# Altium integrated library LED-SMD_V2.IntLib: 212 symbols (continued)
## ORANGE_ZUO55W-05 (continued)
LED SMD 1206 Orange; Manufacturer: Nicomatic; Part Number: ZUO55W-05; Package: LED1206-Orange-05; EDM-PN: *; Text1: *; SAAB PN: *; DCE Part No: *
footprint LED1206-Orange-05 (LED, 1206, 2-Leads, Body 2.0x1.3mm, IPC Medium Density)
pins: 1 K, 2 A

## PM2L-3LLE-SD
designator UV?
LED UV 3W Power 390-400nm; Manufacturer: ProLight Opto; Part Number: PM2L-3LLE-SD; Package: PM2L-3LLx-SD; EDM-PN: *; Text1: *; Text2: *; SAAB PN: *; Value: PM2L-3LLE-SD; DCE Part No: *
footprint PM2L-3LLx-SD (PM2L-3LLx-SD 0.0x0.0mm)
pins: 1 K, 2 A, 3 TAB

## PS11911RB
designator PT?
Phototransistor - Reverse Mount; Manufacturer: Stanley; Package: PS11911RB; EDM-PN: *; Text1: *; Value: PS11911RB; Text2: *; SAAB PN: *; Part Number: PS11911RB; DCE Part No: *
footprint PS1191RB (PS1191RB 3.2x1.6mm)
pins: 1 C, 2 E
text: B

## QLS6B-FKW_CNSNSF043
designator LD?, comment QLS6B-FKW-CNSNSF043
LED Tri Colour RGB Rt Angle; Manufacturer: Cree; Part Number: QLS6B-FKW-CNSNSF043; Package: CREE-QLS6; EDM-PN: *; SAAB PN: *; Value: QLS6B-FKW-CNSNSF043; DCE Part No: *
footprint CREE-QLS6 (QLS6 4.7x1.5mm)
pins: 1 BA, 2 BC, 3 RA, 4 RC, 5 GA, 6 GC
text: B; R; G

## RED-0805-APHCM2012SURCK-F01
designator LD?, comment value RED  Text2: 0805  (hidden comment: APHCM2012SURCK-F01)
LED SMD 0805 Red; Manufacturer: Kingbright; Part Number: APHCM2012SURCK-F01; Package: LED0805-RED-APHCM2012; EDM-PN: *; Text1: *; SAAB PN: *; DCE Part No: *
footprint LED0805-RED-APHCM2012 (APHCM2012 0805)
pins: 1 K, 2 A

## RED-GREEN_HSMF-C155
designator LD?, comment HSMF-C155
LED Bi-Color Red/Green; Manufacturer: Broadcom; Part Number: HSMF-C155; Package: LTST-C235-Red-Green; EDM-PN: *; SAAB PN: *; Value: HSMF-C155; DCE Part No: *
footprint HSMF-C155 (HSMF-C155 3.2x2.7mm)
pins: 1 AG, 2 KG, 3 AR, 4 KR
text: G; R

## RED-GREEN_KPBD-3224SURKZGC
designator LD?, comment Text1: RED/GREEN  (hidden comment: KPBD-3224SURKZGC)
LED SMD Red/Green Bicolor; Manufacturer: Kingbright; Part Number: KPBD-3224SURKZGC; Package: LED-DUAL-3.2X2.4; EDM-PN: *; Value: KPBD-3224SURKZGC; SAAB PN: *; Text2: *; DCE Part No: *
footprint LED-Dual-3.2x2.4 (LED Dual 3.2x2.4mm)
pins: 1 RA, 2 RK, 3 GA, 4 GK
text: R; G

## RED-GREEN_LSG-T676
designator LD?, comment LSG-T676
LED SMD Red/Green Bicolor; Manufacturer: Osram; Part Number: LSG-T676; Package: LSG-T676; EDM-PN: *; SAAB PN: *; Text1: *; Value: LSG-T676; DCE Part No: *
footprint LSG-T676 (LSG-T676 3.4x3.0mm)
pins: 1 RA, 2 RK, 3 GA, 4 GK
text: R; G

## RED-GREEN_LTST-C235KGKRKT
designator LD?, comment value LTST-C235  (hidden comment: LTST-C235KGKRKT)
LED Bi-Color Red/Green; Manufacturer: LITEON; Part Number: LTST-C235KGKRKT; Package: LTST-C235-Red-Green; EDM-PN: *; SAAB PN: *; DCE Part No: *
footprint LTST-C235-Red-Green (LTST-C235)
pins: 1 KG, 2 AG, 3 AR, 4 KR
text: G; R

## RED-GREEN_LTST-S115KRKGKT
designator LD?, comment Text1: RED/GREEN  (hidden comment: RED-GREEN-LTST-S115KRKGKT)
LED SMD Red/Green Bicolor; Manufacturer: LITEON; Part Number: LTST-S115KRKGKT; Package: LTST-S115-R-G-Rt; EDM-PN: *; Value: LTST-S115KRKGKT; SAAB PN: *; DCE Part No: *
footprint LTST-S115-R/G-Rt (LTST-S115-R/G-Rt 3.2x1.5mm)
pins: A, C1 R, C2 G

## RED-GREEN_VS4J98
designator LD?, comment VS4J98
LED Bi-Color Red/Green; Manufacturer: Victory Electronics; Part Number: VS4J98; Package: LED0805-DUAL-RG; EDM-PN: *; SAAB PN: *; Value: VS4J98; DCE Part No: *
footprint LED0805-DUAL-RG (LED 0805 Dual 2.0x1.25mm)
pins: 1 KR, 2 KG, 3 AR, 4 AG
text: R; G

## RED-HER_HSMS-C170
designator LD?  value RED_HER  Text2: C170  (hidden comment: RED-HER_HSMS-C170)
LED SMD 0805 Red Her; Manufacturer: Avago; Part Number: HSMS-C170; Package: LED0805-Red; EDM-PN: *; Text1: *; SAAB PN: *; DCE Part No: *
footprint LED0805-Red (LED, 0805, 2-Leads, Body 2.0x1.3mm, IPC Medium Density)
pins: 1 K, 2 A

## RED-KS DMLN31.23-FYHX-68-J3T3
designator LD?, comment value RED  Text2: 31.23  (hidden comment: KS DMLN31.23-FYHX-68-J3T3)
LED Lighting Color SYNIOS Red 632nm; Manufacturer: Osram; Part Number: KS DMLN31.23-FYHX-68-J3T3; Package: KS DMLN31_23; EDM-PN: *; Reutech PN: *; Text1: *; SAAB PN: *; DCE Part No: *
footprint KS DMLN31_23 (KS DMLN31.23 2.75x2.0mm)
pins: 1 K, 2 A

## RED-LR G6SP-CBEA-1-1-Z
designator LD?, comment LR G6SP-CBEA-1-1-Z
LED Red 625nm; Manufacturer: Osram; Part Number: LR G6SP-CBEA-1-1-Z; Package: LED-LR G6SP; EDM-PN: *; SAAB PN: *; Value: LR G6SP-CBEA-1-1-Z; DCE Part No: *
footprint LED-LR G6SP (LR G6SP 3.3x3.0mm)
pins: 1, A1 A, A2 A, A3 A, A4 A, C1 C

## RED-LR G6SP-CBEA-1-1-Z-ALT
designator LD?, comment LR G6SP-CBEA-1-1-Z
LED Red 625nm; Manufacturer: Osram; Part Number: LR G6SP-CBEA-1-1-Z; Package: LED-LR G6SP; EDM-PN: *; SAAB PN: *; Value: LR G6SP-CBEA-1-1-Z; DCE Part No: *
footprint LED-LR G6SP (LR G6SP 3.3x3.0mm)
pins: A1 A, A2 A, A3 A, A4 A, C1 C

## RED-LR T68F-U1AA-1-1-Z
designator LD?, comment value RED  Text2: T68F  (hidden comment: LR T68F-U1AA-1-1-Z)
LED Red SMD; Manufacturer: Osram; Part Number: LR T68F-U1AA-1-1-Z; Package: LED-PLCC-2-RED; EDM-PN: *; Text1: *; SAAB PN: *; DCE Part No: *
footprint LED-PLCC-2-RED (LED, PLCC2 2-Leads, Body 3.2x2.8mm)
pins: 1 K, 2 A

## RED-LS A67F-U1AA-1-1-30-R33-Z
designator LD?, comment value RED  (hidden comment: LS A67F-U1AA-1-1-30-R33-Z)
LED Red Right Angle; Manufacturer: Osram; Part Number: LS A67F-U1AA-1-1-30-R33-Z; Package: LED-LX676-RED; EDM-PN: *; Text1: *; SAAB PN: *; DCE Part No: *
footprint LED-LX676-RED (LED, LX 676 2-Leads, Body 4.2x4.2mm)
pins: 1 K, 2 A

## RED-LS-A676-P2S1-1
designator LD?, comment value RED  Text2: A676  (hidden comment: LS-A676-P2S1-1)
LED Red Right Angle; Manufacturer: Osram; Part Number: LS-A676-P2S1-1; Package: LED-LX676-RED; EDM-PN: *; Text1: *; SAAB PN: *; DCE Part No: *
footprint LED-LX676-RED (LED, LX 676 2-Leads, Body 4.2x4.2mm)
pins: 1 K, 2 A

## RED-ORANGE_LTST-C170KAKT
designator LD?, comment value RED/ORANGE  Text2: C170  (hidden comment: RED-ORANGE_LTST-0805_SMD)
LED SMD 0805 Red/Orange; Manufacturer: LITEON; Part Number: LTST-C170KAKT; Reutech PN: 5961-LE-0104; Package: LED0805-Red/Orange; EDM-PN: *; Text1: *; SAAB PN: *; DCE Part No: *
footprint LED0805-Red/Orange (LED, 0805, 2-Leads, Body 2.0x1.3mm, IPC Medium Density)
pins: 1 K, 2 A

## RED_12-21/R6C-AR1S2B/2C
designator LD?, comment value RED  Text2: 12-21  (hidden comment: 12-21/R6C-AR1S2B/2C)
LED SMD Right Angle Red; Manufacturer: Everlight; DCE Part No: 9445; Part Number: 12-21/R6C-AR1S2B/2C; Package: LED-RT-3.0X2.0MM-Red; EDM-PN: *; SAAB PN: *; Text1: *
footprint LED-RT-3.0X2.0MM-RED (LED-RT 3.0x2.0mm Red)
pins: 1 K, 2 A, 3 MT hidden

## RED_0402_SML-P11UTT86
designator LD?, comment value RED  Text2: 0402  (hidden comment: RED_0402_SMD)
LED SMD 0402 Red; Manufacturer: Rohm; Part Number: SML-P11UTT86; Package: LED00402-SML-P11-Red; EDM-PN: *; Text1: *; Reutech PN: *; SAAB PN: *; DCE Part No: *
footprint LED00402-SML-P11-Red (LED 0402 1.0x0.5mm)
pins: 1 K, 2 A

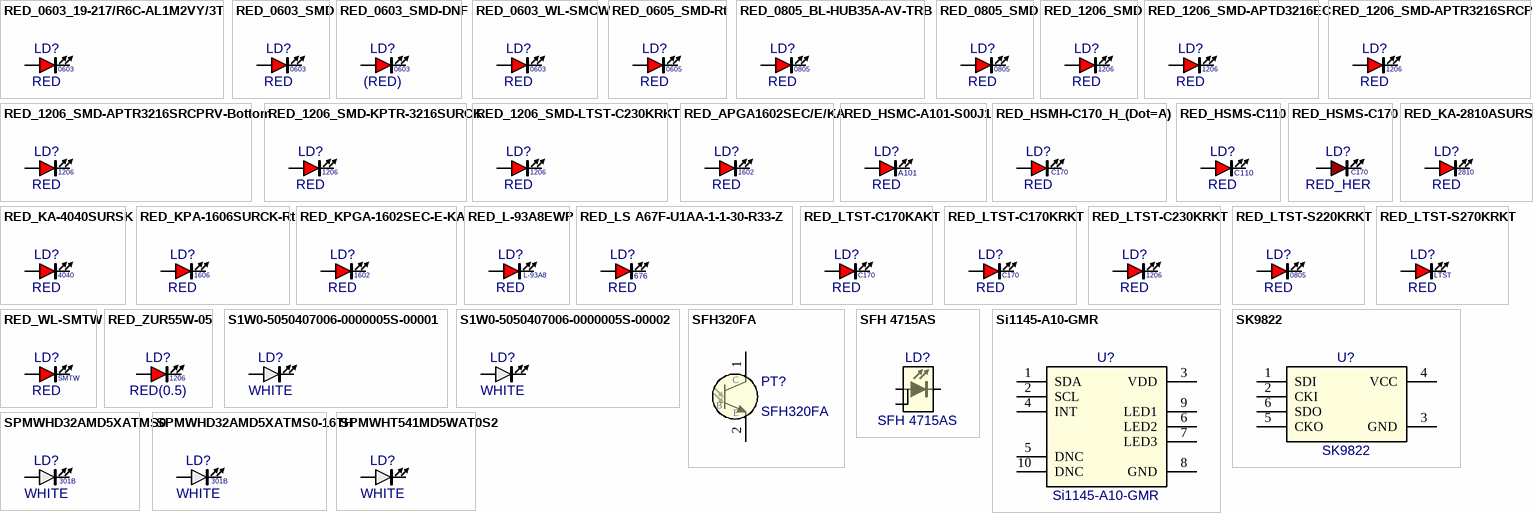
[diagram p3: symbols RED_0603_19-217/R6C-AL1M2VY/3T to SPMWHT541MD5WAT0S2]

## RED_0603_19-217/R6C-AL1M2VY/3T
designator LD?, comment value RED  Text2: 0603  (hidden comment: 19-217/R6C-AL1M2VY/3T)
LED SMD 0603 Red; Manufacturer: Everlight; EDM-PN: LED216; Part Number: 19-217/R6C-AL1M2VY/3T; Package: LED0603-RED-0.4; Text1: *; Reutech PN: *; SAAB PN: *; DCE Part No: *
footprint LED0603-RED-0.4 (LED, 0603, 2-Leads, Body 1.6x0.8mm, IPC Medium Density)
pins: 1 K, 2 A

## RED_0603_SMD
designator LD?  value RED  Text2: 0603  (hidden comment: RED_0603_SMD)
LED SMD 0603 Red; Manufacturer: Various; EDM-PN: LED48; Reutech PN: 5961-LE-0096; SAAB PN: 1AYC00062AEA; Part Number: RED_0603_SMD; Package: LED0603-Red; Text1: *; DCE Part No: *
footprint LED0603-red (LED, 0603, 2-Leads, Body 1.6x0.8mm, IPC Medium Density)
pins: 1 K, 2 A

## RED_0603_SMD-DNF
designator LD?  value (RED)  Text2: 0603  (hidden comment: RED_0603_SMD-DNF)
LED SMD 0603 Red - Do not Fit; Manufacturer: Various; Part Number: DNF - RED_0603; EDM-PN: DNF; Reutech PN: 5961-LE-0096; SAAB PN: 1AYC00062AEA; Package: LED0603-Red; Text1: *; DCE Part No: *
footprint LED0603-red (LED, 0603, 2-Leads, Body 1.6x0.8mm, IPC Medium Density)
pins: 1 K, 2 A

## RED_0603_WL-SMCW
designator LD?  value RED  Text2: 0603  (hidden comment: RED_0603_WL-SMCW)
LED SMD 0603 Red 250mcd; Manufacturer: Wurth; Part Number: 150060RS75000; EDM-PN: LED159; Reutech PN: 5961-LE-; Package: WL-SMCW-0603-RED; Text1: *; SAAB PN: *; DCE Part No: *
footprint WL-SMCW-0603-RED (WL-SMCW-0603-RED 1.6x0.8mm)
pins: 1 K, 2 A

## RED_0605_SMD-Rt
designator LD?  value RED  Text2: 0605  (hidden comment: RED_0605_SMD-Rt)
LED SMD 0605 Red Rt Angle; Manufacturer: Rohm; Part Number: SML-A12UT; Package: LED0605-Red-Rt; EDM-PN: *; Text1: *; SAAB PN: *; DCE Part No: *
footprint LED0605-Red-Rt (LED, 0605 1.6x1.15mm)
pins: 1 K, 2 A

## RED_0805_BL-HUB35A-AV-TRB
designator LD?, comment value RED  Text2: 0805  (hidden comment: RED_BL-HUB35A-AV-TRB)
LED SMD 0805 Super Red; Manufacturer: Bright Led; Part Number: BL-HUB35A-AV-TRB; Package: LED0805-Red; EDM-PN: *; Text1: *; SAAB PN: *; DCE Part No: *
footprint LED0805-Red (LED, 0805, 2-Leads, Body 2.0x1.3mm, IPC Medium Density)
pins: 1 K, 2 A

## RED_0805_SMD
designator LD?  value RED  Text2: 0805  (hidden comment: RED_0805_SMD)
LED SMD 0805 Red; Manufacturer: Various; EDM-PN: LED7; Part Number: RED_0805_SMD; Package: LED0805-Red; Text1: *; SAAB PN: *; DCE Part No: *
footprint LED0805-Red (LED, 0805, 2-Leads, Body 2.0x1.3mm, IPC Medium Density)
pins: 1 K, 2 A

## RED_1206_SMD
designator LD?  value RED  Text2: 1206  (hidden comment: RED_1206_SMD)
LED SMD 1206 Red; Manufacturer: Various; EDM-PN: LED10; Part Number: RED_1206_SMD; Package: LED1206-Red; Text1: *; SAAB PN: *; DCE Part No: *
footprint LED1206-Red (LED, 1206, 2-Leads, Body 2.0x1.3mm, IPC Medium Density)
pins: 1 K, 2 A

## RED_1206_SMD-APTD3216EC
designator LD?, comment value RED  Text2: 1206  (hidden comment: APTD3216EC)
LED SMD 1206 Red Clear; Manufacturer: Kingbright; Part Number: APTD3216EC; Package: APTD3216-RED; EDM-PN: *; Text1: *; SAAB PN: *; DCE Part No: *
footprint APTD3216-RED (APTD3216 Red 3.2x1.6mm)
pins: 1 K, 2 A

## RED_1206_SMD-APTR3216SRCPRV
designator LD?, comment value RED  Text2: 1206  (hidden comment: APTR3216SRCPRV)
LED SMD 1206 Red Clear; Manufacturer: Kingbright; Part Number: APTR3216SRCPRV; Package: APTR3216-RED; EDM-PN: *; Text1: *; SAAB PN: *; DCE Part No: *
footprint APTR3216-RED (APTR3216 3.2x1.6mm)
pins: 1 K, 2 A

## RED_1206_SMD-APTR3216SRCPRV-Bottom
designator LD?, comment value RED  Text2: 1206  (hidden comment: APTR3216SRCPRV)
LED SMD 1206 Red Clear; Manufacturer: Kingbright; Part Number: APTR3216SRCPRV; Package: APTR3216-RED-BOTTOM; EDM-PN: *; Text1: *; SAAB PN: *; DCE Part No: *
footprint APTR3216-RED-BOTTOM (APTR3216 3.2x1.6mm)
pins: 1 K, 2 A

## RED_1206_SMD-KPTR-3216SURCK
designator LD?, comment value RED  Text2: 1206  (hidden comment: KPTR-3216SURCK)
LED SMD 1206 Red Clear Rev Mount; Manufacturer: Kingbright; Part Number: KPTR-3216SURCK; Package: KPTR3216-RED; EDM-PN: *; Text1: *; SAAB PN: *; DCE Part No: *
footprint KPTR3216-RED (KPTR3216 3.2x1.6mm)
pins: 1 K, 2 A

## RED_1206_SMD-LTST-C230KRKT
designator LD?, comment value RED  Text2: 1206  (hidden comment: LTST-C230KRKT)
LED SMD 1206 Red 2V 631nm; Manufacturer: Lite-On; Part Number: LTST-C230KRKT; Package: LED1206-Red; EDM-PN: *; Text1: *; SAAB PN: *; DCE Part No: *
footprint LED1206-Red (LED, 1206, 2-Leads, Body 2.0x1.3mm, IPC Medium Density)
pins: 1 K, 2 A

## RED_APGA1602SEC/E/KA
designator LD?  value RED  Text2: 1602  (hidden comment: RED_APGA1602SEC/E/KA)
LED SMD Red Rt Angle 1.6x0.9mm; Manufacturer: Kingbright; Part Number: APGA1602SEC/E/KA; Package: KPGA-1602; EDM-PN: *; Text1: *; SAAB PN: *; DCE Part No: *
footprint KPGA-1602 (KPGA-1602 1.6x0.9mm)
pins: 1 K, 2 A

## RED_HSMC-A101-S00J1
designator LD?, comment value RED  Text2: A101  (hidden comment: HSMC-A101-S00J1)
LED Red SMD High-Bright; Manufacturer: Avago; Part Number: HSMC-A101-S00J1; Package: LED-PLCC-2; EDM-PN: *; Text1: *; SAAB PN: *; DCE Part No: *
footprint LED-PLCC-2 (LED, PLCC2 2-Leads, Body 3.2x2.8mm)
pins: 1 K, 2 A

## RED_HSMH-C170_H_(Dot=A)
designator LD?, comment value RED  Text2: C170  (hidden comment: RED_HSMH-C170)
LED SMD 0805 Red  (Dot = Anode); Manufacturer: Avago; Part Number: HSMH-C170; Package: LED0805-Red; EDM-PN: *; Text1: *; SAAB PN: *; DCE Part No: *
footprint LED0805-Red (LED, 0805, 2-Leads, Body 2.0x1.3mm, IPC Medium Density)
pins: 1 A, 2 K

## RED_HSMS-C110
designator LD?, comment value RED  Text2: C110  (hidden comment: HSMS-C110)
LED SMD Right Angle Red; Manufacturer: Avago; Part Number: HSMS-C110; Package: HSM-C110-SMD; EDM-PN: *; SAAB PN: *; Text1: *; DCE Part No: *
footprint HSM-C110-SMD-Rt (Surface Mount CHIP LED - Rt Angle)
pins: 1 K, 2 A, 3 MT hidden

## RED_HSMS-C170
designator LD?, comment value RED_HER  Text2: C170  (hidden comment: HSMS-C170)
LED SMD 0805 Red Her; Manufacturer: Avago; Part Number: HSMS-C170; Package: LED0805-Red; EDM-PN: *; Text1: *; SAAB PN: *; DCE Part No: *
footprint LED0805-Red (LED, 0805, 2-Leads, Body 2.0x1.3mm, IPC Medium Density)
pins: 1 K, 2 A

## RED_KA-2810ASURSK
designator LD?  value RED  Text2: 2810  (hidden comment: RED_KA-2810ASURSK)
LED SMD Red Right Angle; Manufacturer: Kingbright; Part Number: KA-2810ASURSK; Package: KA-2810ASURSK; EDM-PN: *; Text1: *; SAAB PN: *; DCE Part No: *
footprint KA-2810ASURSK (KA-2810ASURSK 2.8x1.2mm)
pins: 1 K, 2 A

## RED_KA-4040SURSK
designator LD?  value RED  Text2: 4040  (hidden comment: RED_KA-4040SURSK)
LED SMD Red Rt Angle; Manufacturer: Kingbright; Part Number: KA-4040SURSK; Package: KA-4040-Red; EDM-PN: *; Text1: *; SAAB PN: *; DCE Part No: *
footprint KA-4040-Red
pins: 1 K, 2 A

## RED_KPA-1606SURCK-Rt
designator LD?, comment value RED  Text2: 1606  (hidden comment: RED_KPA-1606SURCK)
LED SMD Red Rt Angle 1.6x0.6mm; Manufacturer: Kingbright; EDM-PN: LED69; Part Number: KPA-1606SURCK; Package: LED-RT-1.6x.0.6mm-Red; Text1: *; SAAB PN: *; DCE Part No: *
footprint LED-RT-1.6x.0.6mm-Red (LED-RT Red 1.6x.0.6mm)
pins: 1 K, 2 A

## RED_KPGA-1602SEC-E-KA
designator LD?  value RED  Text2: 1602  (hidden comment: RED_KPGA-1602SEC-E-KA)
LED SMD Red Rt Angle 1.6x0.9mm; Manufacturer: Kingbright; Part Number: KPGA-1602SEC-E-KA; Package: KPGA-1602; EDM-PN: *; Text1: *; SAAB PN: *; DCE Part No: *
footprint KPGA-1602 (KPGA-1602 1.6x0.9mm)
pins: 1 K, 2 A

## RED_L-93A8EWP
designator LD?, comment value RED  Text2: L-93A8  (hidden comment: RED_L-93A8EWP/1SRD/TG-0L)
LED Red 3mm Rt Angle SMD; Manufacturer: Kingbright; Part Number: L-93A8EWP/1SRD/TG-0L; Package: LED3MM-6.3x4.3-GRN; EDM-PN: *; Text1: *; SAAB PN: *; DCE Part No: *
footprint LED3MM-6.3X4.3-RED (LEd 3mm  6.3x4.3mm)
pins: 1 K, 2 A

## RED_LS A67F-U1AA-1-1-30-R33-Z
designator LD?, comment value RED  Text2: 676  (hidden comment: LS A67F-U1AA-1-1-30-R33-Z)
LED Red Right Angle; Manufacturer: Osram; Part Number: LS A67F-U1AA-1-1-30-R33-Z; Package: LED-LX676-RED; EDM-PN: *; Text1: *; SAAB PN: *; DCE Part No: *
footprint LED-LX676-RED (LED, LX 676 2-Leads, Body 4.2x4.2mm)
pins: 1 K, 2 A

## RED_LTST-C170KAKT
designator LD?, comment value RED  Text2: C170  (hidden comment: LTST-C170KAKT)
LED SMD 0805 Red; Manufacturer: LITEON; Reutech PN: 5961-LE-0104; Part Number: LTST-C170KAKT; Package: LED0805-Red; EDM-PN: *; Text1: *; SAAB PN: *; DCE Part No: *
footprint LED0805-Red (LED, 0805, 2-Leads, Body 2.0x1.3mm, IPC Medium Density)
pins: 1 K, 2 A

## RED_LTST-C170KRKT
designator LD?, comment value RED  Text2: C170  (hidden comment: RED_LTST-0805_SMD)
LED SMD 0805 Red; Manufacturer: LITEON; Part Number: LTST-C170KRKT; Reutech PN: 5961-LE-0105; Package: LED0805-Red; EDM-PN: *; Text1: *; SAAB PN: *; DCE Part No: *
footprint LED0805-Red (LED, 0805, 2-Leads, Body 2.0x1.3mm, IPC Medium Density)
pins: 1 K, 2 A

## RED_LTST-C230KRKT
designator LD?, comment value RED  Text2: 1206  (hidden comment: LTST-C230KRKT)
LED SMD 1206 Red 2V 631nm; Manufacturer: Lite-On; Part Number: LTST-C230KRKT; Package: LED1206-Red; EDM-PN: *; Text1: *; SAAB PN: *; DCE Part No: *
footprint LED1206-Red (LED, 1206, 2-Leads, Body 2.0x1.3mm, IPC Medium Density)
pins: 1 K, 2 A

## RED_LTST-S220KRKT
designator LD?, comment value RED  Text2: 0805  (hidden comment: LTST-S220KRKT)
LED SMD Red 631nm; Manufacturer: LITEON; Part Number: LTST-S220KRKT; Package: LTST-S220KRKT; EDM-PN: *; Reutech PN: *; Text1: *; SAAB PN: *; DCE Part No: *
footprint LTST-S220KRKT (LTST-S220KRKT 2.1x1.0mm)
pins: 1 K, 2 A

## RED_LTST-S270KRKT
designator LD?  value RED  Text2: LTST  (hidden comment: RED_LTST-S270KRKT)
LED SMD Red Rt Angle Water Clear; Manufacturer: LITEON; Part Number: LTST-S270KRKT; Package: LTST-S270KRKT; EDM-PN: *; Text1: *; SAAB PN: *; DCE Part No: *
footprint LTST-S270KRKT (LTST-S270KRKT 1.6x1.15mm)
pins: 1 K, 2 A

## RED_WL-SMTW
designator LD?  value RED  Text2: SMTW  (hidden comment: RED_WL-SMTW)
LED WL-SMTW Red; Manufacturer: Wutrh; Part Number: 150141RS73100; Package: LED-WL-SMTW-RED; EDM-PN: *; Text1: *; SAAB PN: *; DCE Part No: *
footprint LED-WL-SMTW-RED (LED WL-SMTW Body 3.2x2.8mm)
pins: 1 K, 2 A

## RED_ZUR55W-05
designator LD?, comment value RED(0.5)  Text2: 1206  (hidden comment: RED_1206_SMD-05)
LED SMD 1206 Red; Manufacturer: Nicomatic; Part Number: ZUR55W-05; Package: LED1206-Red-05; EDM-PN: *; Text1: *; SAAB PN: *; DCE Part No: *
footprint LED1206-Red-05 (LED, 1206, 2-Leads, Body 2.0x1.3mm, IPC Medium Density)
pins: 1 K, 2 A

## S1W0-5050407006-0000005S-00001
designator LD?  value WHITE  (hidden comment: S1W0-5050407006-0000005S-00001)
LED Natural White High-Power 5050 Series 4000K; Manufacturer: Seoul Semi; Part Number: S1W0-5050407006-0000005S-00001; Package: S1W0-5050; EDM-PN: *; Text1: *; Text2: *; SAAB PN: *; DCE Part No: *
footprint S1W0-5050 (S1W0-5050 5.0x5.0mm)
pins: 1 K, 2 A

## S1W0-5050407006-0000005S-00002
designator LD?  value WHITE  (hidden comment: S1W0-5050407006-0000005S-00002)
LED Natural White High-Power 5050 Series 4000K; Manufacturer: Seoul Semi; Part Number: S1W0-5050407006-0000005S-00002; Package: S1W0-5050; EDM-PN: *; Text1: *; Text2: *; SAAB PN: *; DCE Part No: *
footprint S1W0-5050 (S1W0-5050 5.0x5.0mm)
pins: 1 K, 2 A

## SFH320FA
designator PT?
Phototransistor; Manufacturer: Osram; Part Number: Q65110A2472; Package: SFH320FA; EDM-PN: *; Text1: *; Text2: *; SAAB PN: *; DCE Part No: *; Value: SFH320FA
footprint SFH320FA (SFH320FA 2-Leads, Body 3.2x2.8mm)
pins: 1 C, 2 E
text: B

## SFH 4715AS
designator LD?
LED IR lightsource; Manufacturer: Osram; Part Number: SFH 4715AS; Package: SFH4715AS; EDM-PN: *; Text1: *; Text2: *; SAAB PN: *; DCE Part No: *; Value: SFH 4715AS
footprint SFH4715AS (SFH4715AS 3.85x3.85mm)
pins: 1 K, 2 A, 3 TAB

## Si1145-A10-GMR
designator U?
IC Light Sensor with I2C Interface; Manufacturer: Silicon Labs; Package: QFN10-2x2-Si1145/6/7; EDM-PN: *; Text2: *; Text1: *; Value: Si1145-A10-GMR; SAAB PN: *; DCE Part No: *; Part Number: Si1145-A10-GMR
footprint QFN10-2x2-Si1145/6/7 (QFN10 2.0x2.0mm Si Labs)
pins: 1 SDA, 2 SCL, 3 VDD, 4 INT, 5 DNC, 6 LED2, 7 LED3, 8 GND, 9 LED1, 10 DNC

## SK9822
designator U?
IC Intelligent Control LED; Manufacturer: Shenzhen Normand Electronic; Package: LED-PLCC6-5x5; EDM-PN: *; Text2: *; Text1: *; Value: SK9822; SAAB PN: *; DCE Part No: *; Part Number: SK9822
footprint LED-PLCC6-5x5 (PLCC6 5.0x5.0mm)
pins: 1 SDI, 2 CKI, 3 GND, 4 VCC, 5 CKO, 6 SDO

## SPMWHD32AMD5XATMS0
designator LD?  value WHITE  Text2: 301B  (hidden comment: SPMWHD32AMD5XATMS0)
LED SMD Natural White Mid-Power LM301B; Manufacturer: Samsung LED; Part Number: SPMWHD32AMD5XATMS0; Package: LED-LM301B-WHITE; EDM-PN: *; Reutech PN: *; Text1: *; SAAB PN: *; DCE Part No: *
footprint LED-LM301B-WHITE (LM301B WHITE 3.3x3.0mm)
pins: 1 K, 2 A

## SPMWHD32AMD5XATMS0-16TH
designator LD?, comment value WHITE  Text2: 301B  (hidden comment: SPMWHD32AMD5XATMS0)
LED SMD Natural White Mid-Power LM301B; Manufacturer: Samsung LED; Part Number: SPMWHD32AMD5XATMS0; Package: LED-LM301B-WHITE-16TH; EDM-PN: *; Reutech PN: *; Text1: *; SAAB PN: *; DCE Part No: *
footprint LED-LM301B-WHITE-16Th (LM301B WHITE 3.3x3.0mm)
pins: 1 K, 2 A

## SPMWHT541MD5WAT0S2
designator LD?  value WHITE  (hidden comment: SPMWHT541MD5WAT0S2)
LED SMD Natural White Mid-Power LM561B; Manufacturer: Samsung LED; Part Number: SPMWHT541MD5WAT0S2; Package: SPMWHT541MD5WAxxxx; EDM-PN: *; Text1: *; Text2: *; SAAB PN: *; DCE Part No: *
footprint SPMWHT541MD5WAxxxx (SPMWHT541MD5WAxxxx 5.0x3.0mm)
pins: 1 K, 2 A

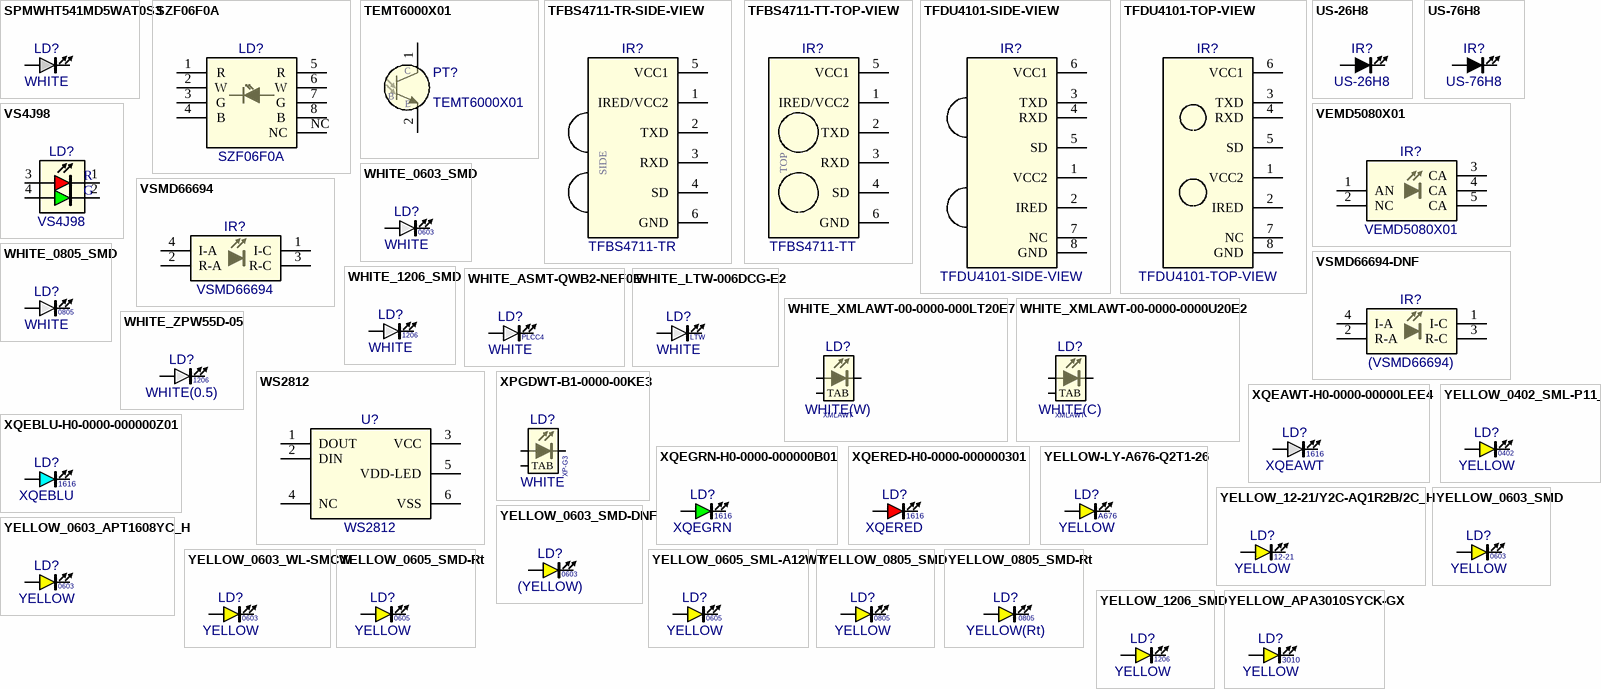
[diagram p4: symbols SPMWHT541MD5WAT0S3 to YELLOW_APA3010SYCK-GX]

## SPMWHT541MD5WAT0S3
designator LD?  value WHITE  (hidden comment: SPMWHT541MD5WAT0S3)
LED SMD Natural White Mid-Power LM561B; Manufacturer: Samsung LED; Part Number: SPMWHT541MD5WAT0S3; Package: SPMWHT541MD5WAxxxx; EDM-PN: *; Text1: *; Text2: *; SAAB PN: *; DCE Part No: *
footprint SPMWHT541MD5WAxxxx (SPMWHT541MD5WAxxxx 5.0x3.0mm)
pins: 1 K, 2 A

## SZF06F0A
designator LD?
LED Quad; Manufacturer: Seoul Semi; Part Number: SZF06F0A; Package: SZF06F0A; EDM-PN: *; SAAB PN: *; Value: SZF06F0A; DCE Part No: *
footprint SZF06F0A (SZF06F0A 7.0x9.0mm)
pins: 1, 2, 3, 4, 5, 6, 7, 8, NC
text: R; W; G; B

## TEMT6000X01
designator PT?
Phototransistor Ambient Light Sensor; Manufacturer: Vishay; Package: 1206; EDM-PN: *; Text1: *; Text2: *; Part Number: TEMT6000X01; SAAB PN: *; Value: TEMT6000X01; DCE Part No: *
footprint TEMT6000X01 (Phototransistor, 1206, 3-Leads, Body 4x2mm, IPC Medium Density)
pins: 1 C, 2 E
text: B

## TFBS4711-TR-SIDE-VIEW
designator IR?  value TFBS4711-TR  Text1: SIDE  (hidden comment: TFBS4711-TR-SIDE-VIEW)
IR Transceiver Module (SIR); Manufacturer: Vishay; Part Number: TFBS4711-TR; Package: TFBS4711-SIDE; EDM-PN: *; SAAB PN: *; DCE Part No: *
footprint TFBS4711-Side (TFBS4711 6.0x3.0mm)
pins: 1 IRED/VCC2, 2 TXD, 3 RXD, 4 SD, 5 VCC1, 6 GND (power)

## TFBS4711-TT-TOP-VIEW
designator IR?  value TFBS4711-TT  Text1: TOP  (hidden comment: TFBS4711-TT-TOP-VIEW)
IR Transceiver Module (SIR); Manufacturer: Vishay; Part Number: TFBS4711-TT; Package: TFBS4711-TOP; EDM-PN: *; SAAB PN: *; DCE Part No: *
footprint TFBS4711-Top (TFBS4711 6.0x1.9mm)
pins: 1 IRED/VCC2, 2 TXD, 3 RXD, 4 SD, 5 VCC1, 6 GND (power)

## TFDU4101-SIDE-VIEW
designator IR?
IR Transceiver Module; Manufacturer: Vishay; Part Number: TFDU4101-SIDE-VIEW; Package: TFDU4101-SIDE; EDM-PN: *; SAAB PN: *; Value: TFDU4101-SIDE-VIEW; DCE Part No: *
footprint TDFU4101-SIDE (IR TFDU4101 Side View)
pins: 1 VCC2, 2 IRED, 3 TXD, 4 RXD, 5 SD, 6 VCC1, 7 NC, 8 GND (power)

## TFDU4101-TOP-VIEW
designator IR?
IR Transceiver Module; Manufacturer: Vishay; Part Number: TFDU4101-TOP-VIEW; Package: TFDU4101-TOP; EDM-PN: *; SAAB PN: *; Value: TFDU4101-TOP-VIEW; DCE Part No: *
footprint TDFU4101-TOP (New Pattern 0.0x0.0mm)
pins: 1 VCC2, 2 IRED, 3 TXD, 4 RXD, 5 SD, 6 VCC1, 7 NC, 8 GND (power)

## US-26H8
designator IR?
IR Emmiting Diode 940nm; Manufacturer: Victory Electronics; Part Number: US-26H8; Package: US-26H8; EDM-PN: *; Text1: *; Text2: *; SAAB PN: *; Value: US-26H8; DCE Part No: *
footprint US-26H8 (US-26H8 1.6x0.8mm, IPC Medium Density)
pins: 1 K, 2 A

## US-76H8
designator IR?
IR Emmiting Diode 940nm; Manufacturer: Victory Electronics; Part Number: US-76H8; Package: US-76H8; EDM-PN: *; Text1: *; Text2: *; SAAB PN: *; Value: US-76H8; DCE Part No: *
footprint US-76H8 (US-76H 3.0x2.0mm)
pins: 1 K, 2 A

## VEMD5080X01
designator IR?
Photodiode 950nm; Manufacturer: Vishay; Part Number: VEMD5080X01; Package: VEMD5080X01; EDM-PN: *; Text1: *; Text2: *; SAAB PN: *; Value: VEMD5080X01; DCE Part No: *
footprint VEMD5080X01 (VEMD5080X01 5.0x4.0mm)
pins: 1 AN, 2 NC, 3 CA, 4 CA, 5 CA

## VS4J98
designator LD?
LED Bi-Color Red/Green; Manufacturer: Victory Electronics; Part Number: VS4J98; Package: LED0805-DUAL-RG; EDM-PN: *; SAAB PN: *; Value: VS4J98; DCE Part No: *
footprint LED0805-DUAL-RG (LED 0805 Dual 2.0x1.25mm)
pins: 1 KR, 2 KG, 3 AR, 4 AG
text: R; G

## VSMD66694
designator IR?
IR Emitting Diode Dual Color 660/940nm; Manufacturer: Vishay; Part Number: VSMD66694; Package: VSMD66694; EDM-PN: *; Text1: *; Text2: *; SAAB PN: *; Value: VSMD66694; DCE Part No: *
footprint VSMD66694 (VSMD66694 0.0x0.0mm)
pins: 1 I-C, 2 R-A, 3 R-C, 4 I-A

## VSMD66694-DNF
designator IR?  value (VSMD66694)  (hidden comment: VSMD66694-DNF)
IR Emitting Diode Dual Color 660/940nm - Do not Fit; Manufacturer: Vishay; Part Number: DNF - VSMD66694; Package: VSMD66694; EDM-PN: *; Text1: *; Text2: *; SAAB PN: *; DCE Part No: *
footprint VSMD66694 (VSMD66694 0.0x0.0mm)
pins: 1 I-C, 2 R-A, 3 R-C, 4 I-A

## WHITE_0603_SMD
designator LD?  value WHITE  Text2: 0603  (hidden comment: WHITE_0603_SMD)
LED SMD 0603 White; Manufacturer: Various; Part Number: WHITE_0603_SMD; Package: LED0603_White; EDM-PN: *; Text1: *; SAAB PN: *; DCE Part No: *
footprint LED0603-White (LED, 0603, 2-Leads, Body 1.6x0.8mm, IPC Medium Density)
pins: 1 K, 2 A

## WHITE_0805_SMD
designator LD?  value WHITE  Text2: 0805  (hidden comment: WHITE_0805_SMD)
LED SMD 0805 White; Manufacturer: Various; Part Number: WHITE_0805_SMD; Package: LED0805-WHITE; EDM-PN: *; Text1: *; SAAB PN: *; DCE Part No: *
footprint LED0805-White (LED, 0805, 2-Leads, Body 2.0x1.3mm, IPC Medium Density)
pins: 1 K, 2 A

## WHITE_1206_SMD
designator LD?  value WHITE  Text2: 1206  (hidden comment: WHITE_1206_SMD)
LED SMD 1206 White; Manufacturer: Various; Part Number: WHITE_1206_SMD; Package: LED1206-WHITE; EDM-PN: *; Text1: *; SAAB PN: *; DCE Part No: *
footprint LED1206-White (LED, 1206, 2-Leads, Body 2.0x1.3mm, IPC Medium Density)
pins: 1 K, 2 A

## WHITE_ASMT-QWB2-NEF0E
designator LD?  value WHITE  Text2: PLCC4  (hidden comment: WHITE_ASMT-QWB2-NEF0E)
LED Cool White PLCC4; Manufacturer: Avago; Part Number: ASMT-QWB2-NEF0E; Package: LED-PLCC4-6-3.2x2.8; EDM-PN: *; Text1: *; SAAB PN: *; DCE Part No: *
footprint LED-PLCC4-6-3.2x2.8 (LED, PLCC2 2-Leads, Body 3.2x2.8mm)
pins: A, C

## WHITE_LTW-006DCG-E2
designator LD?  value WHITE  Text2: LTW  (hidden comment: WHITE_LTW-006DCG-E2)
LED White Rt Angle; Manufacturer: LITEON; Part Number: LTW-006DCG-E2; Package: LTW-006DCG-E2; EDM-PN: *; Text1: *; SAAB PN: *; DCE Part No: *
footprint LTW-006DCG-E2 (LTW-006DCG-E2 1.2x3.8mm)
pins: 1 K, 2 A

## WHITE_XMLAWT-00-0000-000LT20E7
designator LD?  value WHITE(W)  Text2: XMLAWT  (hidden comment: WHITE_XMLAWT-00-0000-000LT20E7)
LED Warm White; Manufacturer: Cree; Part Number: XMLAWT-00-0000-000LT20E7; Package: LED_XMLAWT; EDM-PN: *; Text1: *; SAAB PN: *; DCE Part No: *
footprint LED-XMLAWT (LED XMLAWT 5.0x5.0mm)
pins: 1 K, 2 A, 3 TAB

## WHITE_XMLAWT-00-0000-0000U20E2
designator LD?  value WHITE(C)  Text2: XMLAWT  (hidden comment: WHITE_XMLAWT-00-0000-0000U20E2)
LED Cool White; Manufacturer: Cree; Part Number: XMLAWT-00-0000-0000U20E2; Package: LED_XMLAWT; EDM-PN: *; Text1: *; SAAB PN: *; DCE Part No: *
footprint LED-XMLAWT (LED XMLAWT 5.0x5.0mm)
pins: 1 K, 2 A, 3 TAB

## WHITE_ZPW55D-05
designator LD?, comment value WHITE(0.5)  Text2: 1206  (hidden comment: White_1206_SMD-05)
LED SMD 1206 White; Manufacturer: Nicomatic; Part Number: ZPW55D-05; Package: LED1206-White-05; EDM-PN: *; Text1: *; SAAB PN: *; DCE Part No: *
footprint LED1206-White-05 (LED, 1206, 2-Leads, Body 2.0x1.3mm, IPC Medium Density)
pins: 1 K, 2 A

## WS2812
designator U?
IC Intelligent Control LED; Manufacturer: Word Semi; Package: WS2812; EDM-PN: *; Text2: *; Text1: *; Value: WS2812; SAAB PN: *; Part Number: WS2812; DCE Part No: *
footprint WS2812 (WS2812 5.0x5.0mm)
pins: 1 DOUT, 2 DIN, 3 VCC, 4 NC, 5 VDD-LED, 6 VSS

## XPGDWT-B1-0000-00KE3
designator LD?  value WHITE  Text2: XP-G3  (hidden comment: XPGDWT-B1-0000-00KE3)
LED Xlamp Cool White; Manufacturer: Cree; Part Number: XPGDWT-B1-0000-00KE3; Package: XP-G3-White; EDM-PN: *; Text1: *; SAAB PN: *; DCE Part No: *
footprint XP-G3-White (XP-G3-White 3.45x3.45mm)
pins: 1 K, 2 A, 3 TAB

## XQEAWT-H0-0000-00000LEE4
designator LD?  value XQEAWT  Text2: 1616  (hidden comment: XQEAWT-H0-0000-00000LEE4)
LED XLamp White 1616; Manufacturer: Cree; Part Number: XQEAWT-H0-0000-00000LEE4; Package: XQ-E-White; EDM-PN: *; SAAB PN: *; Text1: *; DCE Part No: *
footprint XQ-E-WHITE (XQ-E-White 1.6x1.6mm)
pins: 1 K, 2 A

## XQEBLU-H0-0000-000000Z01
designator LD?  value XQEBLU  Text2: 1616  (hidden comment: XQEBLU-H0-0000-000000Z01)
LED XLamp Blue 465nm 1616; Manufacturer: Cree; Part Number: XQEBLU-H0-0000-000000Z01; Package: XQ-E-Blue; EDM-PN: *; SAAB PN: *; Text1: *; DCE Part No: *
footprint XQ-E-Blue (XQ-E-Blue 1.6x1.6mm)
pins: 1 K, 2 A

## XQEGRN-H0-0000-000000B01
designator LD?  value XQEGRN  Text2: 1616  (hidden comment: XQEGRN-H0-0000-000000B01)
LED XLamp Green 520nm 1616; Manufacturer: Cree; Part Number: XQEGRN-H0-0000-000000B01; Package: XQ-E-Green; EDM-PN: *; SAAB PN: *; Text1: *; DCE Part No: *
footprint XQ-E-GREEN (XQ-E-Green 1.6x1.6mm)
pins: 1 K, 2 A

## XQERED-H0-0000-000000301
designator LD?  value XQERED  Text2: 1616  (hidden comment: XQERED-H0-0000-000000301)
LED XLamp Red 620nm 1616; Manufacturer: Cree; Part Number: XQERED-H0-0000-000000301; Package: XQ-E-Red; EDM-PN: *; SAAB PN: *; Text1: *; DCE Part No: *
footprint XQ-E-Red (XQ-E-Red 1.6x1.6mm)
pins: 1 K, 2 A

## YELLOW-LY-A676-Q2T1-26
designator LD?, comment value YELLOW  Text2: A676  (hidden comment: LY-A676-Q2T1-26)
LED Yellow Right Angle; Manufacturer: Osram; Part Number: LY-A676-Q2T1-26; Package: LED-LX676-YELLOW; EDM-PN: *; Text1: *; SAAB PN: *; DCE Part No: *
footprint LED-LX676-YELLOW (LED, LX 676 2-Leads, Body 4.2x4.2mm)
pins: 1 K, 2 A

## YELLOW_12-21/Y2C-AQ1R2B/2C_H
designator LD?, comment value YELLOW  Text2: 12-21  (hidden comment: 12-21/Y2C-AQ1R2B/2C)
LED SMD Right Angle Yellow; Manufacturer: Everlight; Part Number: 12-21/Y2C-AQ1R2B/2C; Package: LED-RT-3.0X2.0MM-Yellow; EDM-PN: *; SAAB PN: *; Text1: *; DCE Part No: *
footprint LED-RT-3.0X2.0MM-Yellow (LED-RT 3.0x2.0mm Yellow)
pins: 1 K, 2 A, 3 MT hidden

## YELLOW_0402_SML-P11_H
designator LD?, comment value YELLOW  Text2: 0402  (hidden comment: YELLOW_0402_SMD)
LED SMD 0402 Yellow; Manufacturer: Rohm; Part Number: SML-P11YTT86; Package: LED00402-SML-P11-YELLOW; EDM-PN: *; Text1: *; Reutech PN: *; SAAB PN: *; DCE Part No: *
footprint LED00402-SML-P11-Yellow (LED 0402 1.0x0.5mm)
pins: 1 K, 2 A

## YELLOW_0603_APT1608YC_H
designator LD?, comment value YELLOW  Text2: 0603  (hidden comment: APT1608YC)
LED SMD 0603 Yellow; Manufacturer: Kingbright; Part Number: APT1608YC; Package: LED0603_Yellow; EDM-PN: *; Text1: *; SAAB PN: *; DCE Part No: *
footprint LED0603-Yellow (LED, 0603, 2-Leads, Body 1.6x0.8mm, IPC Medium Density)
pins: 1 K, 2 A

## YELLOW_0603_SMD
designator LD?  value YELLOW  Text2: 0603  (hidden comment: YELLOW_0603_SMD)
LED SMD 0603 Yellow; Manufacturer: Various; EDM-PN: LED47; Part Number: YELLOW_0603_SMD; Package: LED0603_Yellow; Text1: *; SAAB PN: *; DCE Part No: *
footprint LED0603-Yellow (LED, 0603, 2-Leads, Body 1.6x0.8mm, IPC Medium Density)
pins: 1 K, 2 A

## YELLOW_0603_SMD-DNF
designator LD?, comment value (YELLOW)  Text2: 0603  (hidden comment: YELLOW_0603_SMD)
LED SMD 0603 Yellow - Do not Fit; Manufacturer: Various; Part Number: DoNF - YELLOW_0603; EDM-PN: DNF; Package: LED0603_Yellow; Text1: *; SAAB PN: *; DCE Part No: *
footprint LED0603-Yellow (LED, 0603, 2-Leads, Body 1.6x0.8mm, IPC Medium Density)
pins: 1 K, 2 A

## YELLOW_0603_WL-SMCW
designator LD?  value YELLOW  Text2: 0603  (hidden comment: YELLOW_0603_WL-SMCW)
LED SMD 0603 Yellow 120mcd; Manufacturer: Wurth; Part Number: 150060YS75000; EDM-PN: LED163; Reutech PN: 5961-LE-; Package: WL-SMCW-0603-YELLOW; Text1: *; SAAB PN: *; DCE Part No: *
footprint WL-SMCW-0603-YELLOW (WL-SMCW-0603-YELLOW 1.6x0.8mm)
pins: 1 K, 2 A

## YELLOW_0605_SMD-Rt
designator LD?  value YELLOW  Text2: 0605  (hidden comment: YELLOW_0605_SMD-Rt)
LED SMD 0605 Yellow Rt Angle; Manufacturer: Rohm; Part Number: SML-A12WT; Package: LED0605-Yellow-Rt; EDM-PN: *; Text1: *; SAAB PN: *; DCE Part No: *
footprint LED0605-Yellow-Rt (LED, 0605 1.6x1.15mm)
pins: 1 K, 2 A

## YELLOW_0605_SML-A12WT
designator LD?, comment value YELLOW  Text2: 0605  (hidden comment: SML-A12WT)
LED SMD 0605 Yellow Rt Angle; Manufacturer: Rohm; Part Number: SML-A12WT; Package: LED0605-Yellow-Rt; EDM-PN: *; Text1: *; SAAB PN: *; DCE Part No: *
footprint LED0605-Yellow-Rt (LED, 0605 1.6x1.15mm)
pins: 1 K, 2 A

## YELLOW_0805_SMD
designator LD?  value YELLOW  Text2: 0805  (hidden comment: YELLOW_0805_SMD)
LED SMD 0805 Yellow; Manufacturer: Various; EDM-PN: LED41; Part Number: YELLOW_0805_SMD; Package: LED0805-Yellow; Text1: *; SAAB PN: *; DCE Part No: *
footprint LED0805-Yellow (LED, 0805, 2-Leads, Body 2.0x1.3mm, IPC Medium Density)
pins: 1 K, 2 A

## YELLOW_0805_SMD-Rt
designator LD?, comment value YELLOW(Rt)  Text2: 0805  (hidden comment: Yellow_0805_SMD-RT)
LED SMD 0805 Yellow Rt Angle; Manufacturer: Various; Part Number: Yellow_0805_Rt; Package: LED0805-Yellow-Rt; EDM-PN: *; Text1: *; SAAB PN: *; DCE Part No: *
footprint LED0805-YELLOW-RT (LED0805 Yellow Rt 2.1x1.0mm)
pins: 1 K, 2 A

## YELLOW_1206_SMD
designator LD?  value YELLOW  Text2: 1206  (hidden comment: YELLOW_1206_SMD)
LED SMD 1206 Yellow; Manufacturer: Various; Part Number: YELLOW_1206_SMD; Package: LED1206-Yellow; EDM-PN: *; Text1: *; SAAB PN: *; DCE Part No: *
footprint LED1206-Yellow (LED, 1206, 2-Leads, Body 2.0x1.3mm, IPC Medium Density)
pins: 1 K, 2 A

## YELLOW_APA3010SYCK-GX
designator LD?, comment value YELLOW  Text2: 3010  (hidden comment: APA3010SYCK-GX)
LED SMD Right Angle Yellow; Manufacturer: Kingbright; Part Number: APA3010SYCK-GX; Package: KPA-3010-Yellow; EDM-PN: *; SAAB PN: *; Text1: *; DCE Part No: *
footprint APA3010-Yellow (LED-RT 3.0x2.0mm Yellow)
pins: 1 K, 2 A, 3 MT hidden

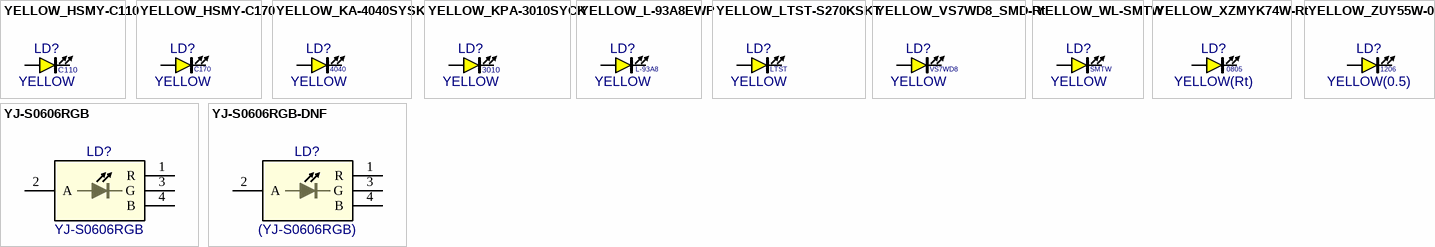
[diagram p5: symbols YELLOW_HSMY-C110 to YJ-S0606RGB-DNF]

## YELLOW_HSMY-C110
designator LD?, comment value YELLOW  Text2: C110  (hidden comment: HSMY-C110)
LED SMD Right Angle Yellow; Manufacturer: Avago; Part Number: HSMY-C110; Package: HSM-C110-SMD; EDM-PN: *; SAAB PN: *; Text1: *; DCE Part No: *
footprint HSM-C110-SMD-Rt (Surface Mount CHIP LED - Rt Angle)
pins: 1 K, 2 A, 3 MT hidden

## YELLOW_HSMY-C170
designator LD?, comment value YELLOW  Text2: C170  (hidden comment: HSMY-C170)
LED SMD 0805 Yellow; Manufacturer: Avago; Part Number: HSMY-C170; Package: LED0805-Yellow; EDM-PN: *; Text1: *; SAAB PN: *; DCE Part No: *
footprint LED0805-Yellow (LED, 0805, 2-Leads, Body 2.0x1.3mm, IPC Medium Density)
pins: 1 K, 2 A

## YELLOW_KA-4040SYSK
designator LD?  value YELLOW  Text2: 4040  (hidden comment: YELLOW_KA-4040SYSK)
LED SMD Yellow Rt Angle; Manufacturer: Kingbright; Part Number: KA-4040SYSK; Package: KA-4040-Yellow; EDM-PN: *; Text1: *; SAAB PN: *; DCE Part No: *
footprint KA-4040-Yellow
pins: 1 K, 2 A

## YELLOW_KPA-3010SYCK
designator LD?, comment value YELLOW  Text2: 3010  (hidden comment: KPA-3010SYCK)
LED SMD Right Angle Yellow; Manufacturer: Kingbright; Part Number: KPA-3010SYCK; Package: KPA-3010-Yellow; EDM-PN: *; SAAB PN: *; Text1: *; DCE Part No: *
footprint KPA-3010-Yellow (LED-RT 3.0x2.0mm Yellow)
pins: 1 K, 2 A, 3 MT hidden

## YELLOW_L-93A8EWP
designator LD?, comment value YELLOW  Text2: L-93A8  (hidden comment: YELLOW_L-93AEWP/1YD/TG-0L)
LED Yellow 3mm Rt Angle SMD; Manufacturer: Kingbright; Part Number: L-93A8EWP/1YD/TG-0L; Package: LED3MM-6.3x4.3-YEL; EDM-PN: *; Text1: *; SAAB PN: *; DCE Part No: *
footprint LED3MM-6.3X4.3-YEL (LEd 3mm  6.3x4.3mm)
pins: 1 K, 2 A

## YELLOW_LTST-S270KSKT
designator LD?  value YELLOW  Text2: LTST  (hidden comment: YELLOW_LTST-S270KSKT)
LED SMD Red Rt Angle Water Clear; Manufacturer: LITEON; Part Number: LTST-S270KSKT; Package: LTST-S270KSKT; EDM-PN: *; Text1: *; SAAB PN: *; DCE Part No: *
footprint LTST-S270KRKT (LTST-S270KRKT 1.6x1.15mm)
pins: 1 K, 2 A

## YELLOW_VS7WD8_SMD-Rt
designator LD?  value YELLOW  Text2: VS7WD8  (hidden comment: YELLOW_VS7WD8_SMD-Rt)
LED SMD VS7WD8 Yellow Rt Angle; Manufacturer: Victory Electronics; Part Number: VS7WD8; Package: VS7WD8; EDM-PN: *; Text1: *; SAAB PN: *; DCE Part No: *
footprint VS7WD8 (VS7WD8 3.0x2.0mm)
pins: 1 K, 2 A

## YELLOW_WL-SMTW
designator LD?  value YELLOW  Text2: SMTW  (hidden comment: YELLOW_WL-SMTW)
LED WL-SMTW Yellow; Manufacturer: Wutrh; Part Number: 150141YS73100; Package: LED-WL-SMTW-YEL; EDM-PN: *; Text1: *; SAAB PN: *; DCE Part No: *
footprint LED-WL-SMTW-YEL (LED WL-SMTW Body 3.2x2.8mm)
pins: 1 K, 2 A

## YELLOW_XZMYK74W-Rt
designator LD?, comment value YELLOW(Rt)  Text2: 0805  (hidden comment: Yellow_XZMYK74W)
LED SMD 0805 Yellow Rt Angle; Manufacturer: Sunled; Part Number: XZMYK74W; Package: LED0805-Yellow-Rt; EDM-PN: *; Text1: *; SAAB PN: *; DCE Part No: *
footprint LED0805-YELLOW-RT (LED0805 Yellow Rt 2.1x1.0mm)
pins: 1 K, 2 A

## YELLOW_ZUY55W-05
designator LD?, comment value YELLOW(0.5)  Text2: 1206  (hidden comment: YELLOW_1206_SMD-05)
LED SMD 1206 Yellow; Manufacturer: Nicomatic; Part Number: ZUY55W-05; Package: LED1206-Yellow-05; EDM-PN: *; Text1: *; SAAB PN: *; DCE Part No: *
footprint LED1206-Yellow-05 (LED, 1206, 2-Leads, Body 2.0x1.3mm, IPC Medium Density)
pins: 1 K, 2 A

## YJ-S0606RGB
designator LD?
LED Tri Colour; Manufacturer: Avago; Part Number: YJ-S0606RGB; Package: YJ-S0606RGB; EDM-PN: *; SAAB PN: *; Value: YJ-S0606RGB; DCE Part No: *
footprint YJ-S0606RGB (YJ-S0606RGB 1.6x1.5mm)
pins: 1 R, 2 A, 3 G, 4 B

## YJ-S0606RGB-DNF
designator LD?, comment value (YJ-S0606RGB)  (hidden comment: YJ-S0606RGB)
LED Tri Colour - Do not Fit; Manufacturer: Avago; Part Number: DNF - YJ-S0606RGB; Package: YJ-S0606RGB; EDM-PN: *; SAAB PN: *; DCE Part No: *
footprint YJ-S0606RGB (YJ-S0606RGB 1.6x1.5mm)
pins: 1 R, 2 A, 3 G, 4 B